# Altium footprint library Pcblib.PcbLib: 281 footprints (part 13 of 18)
Each footprint in its own frame and in the unit in brackets; x right, y up, seen from the top. Pads: shape width x height; smd on the part's side, far side on the other; paste and mask are expansions set on the pad; w line width, h text height; cw(c..) or ccw(c..) is an arc to the next point about the centre after c.
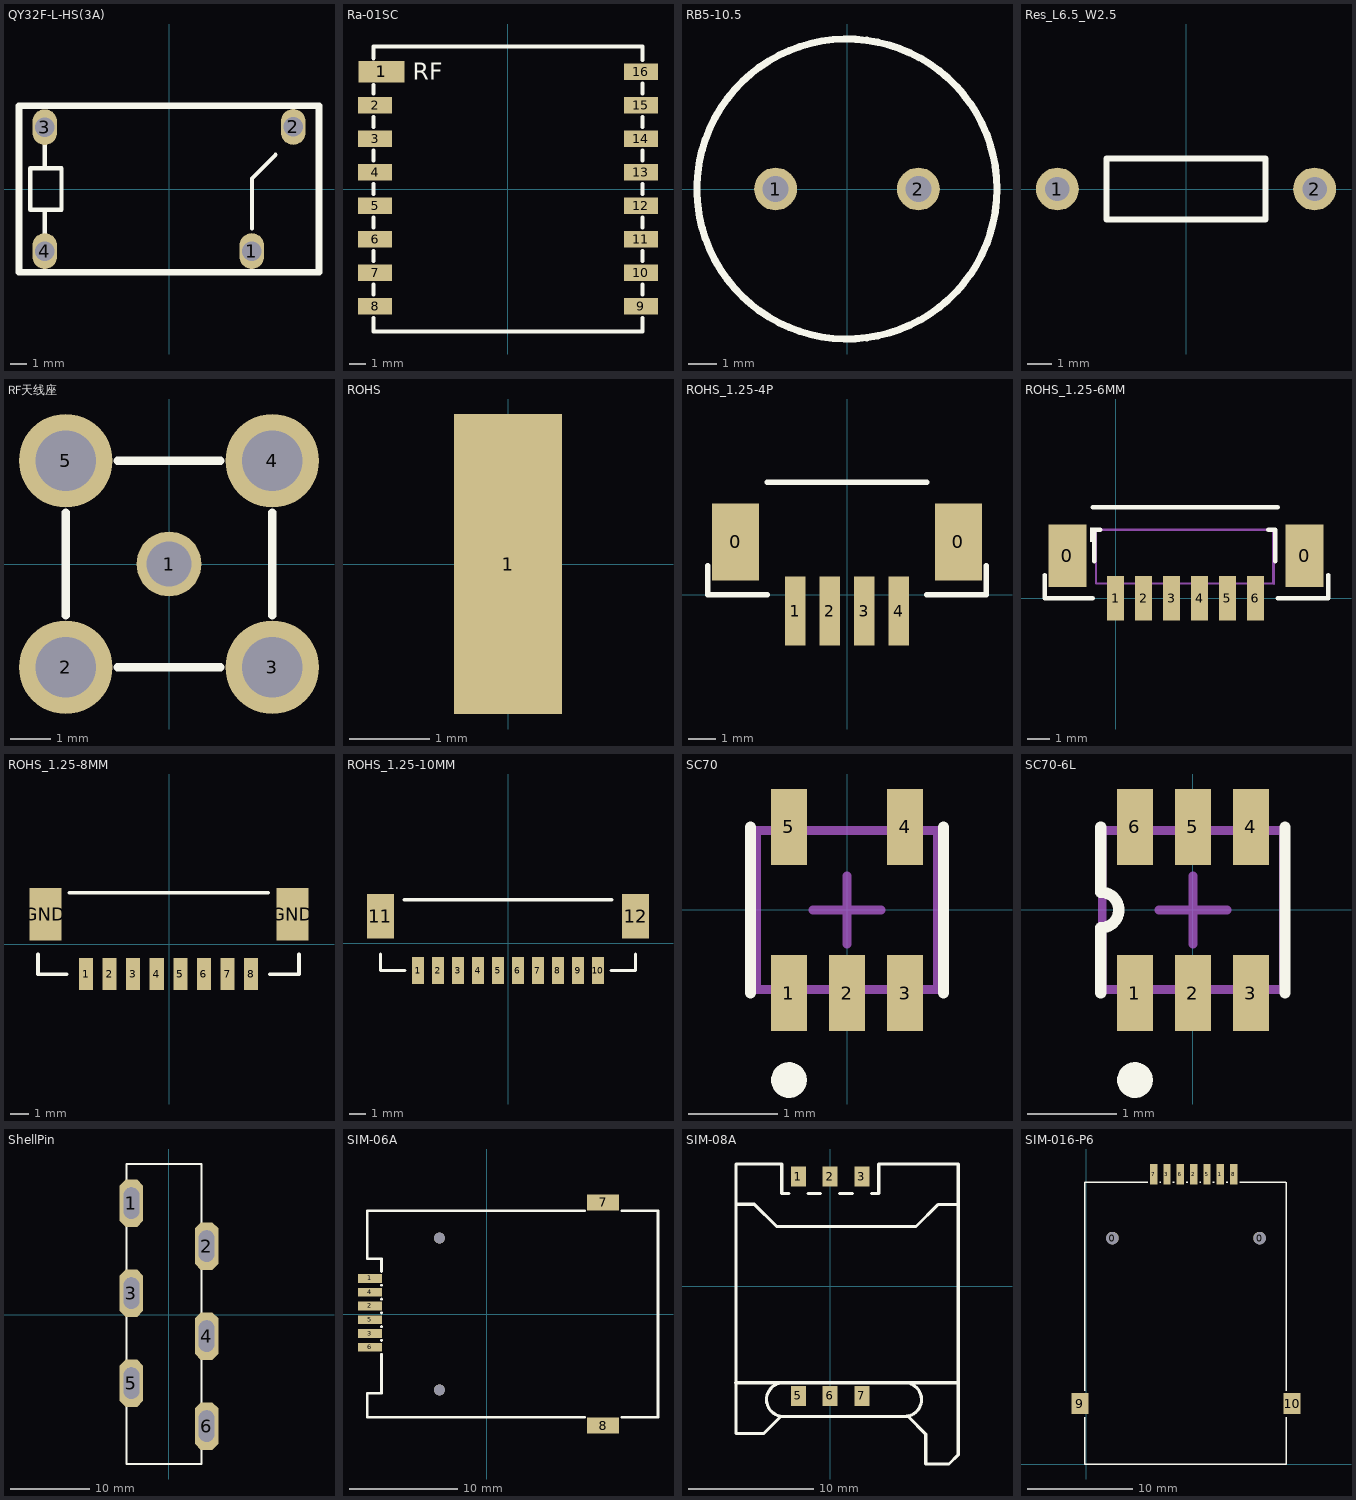
[diagram p12: the footprints below, top view; thin cyan lines are the x and y axes]

## QY32F-L-HS(3A) [mm] "单刀常开,长：18.4mm，宽：10.2mm，高：15.3mm"
pads (4):
  oval 1.5x2.2 hole 1.2: 1(5.08,-3.81) 2(7.62,3.81) 3(-7.62,3.79) 4(-7.62,-3.81)
Top Overlay:
  lines w0.254: -7.62,-2.794 -7.62,-1.27 ; -7.62,1.27 -7.62,2.794 ; 5.08,-2.413 5.08,0.635 6.542,2.097 ; -8.509,-1.27 -6.604,-1.27 -6.604,1.27 -8.509,1.27 -8.509,-1.27
  lines w0.4: -9.2,-5.1 9.2,-5.1 9.2,5.1 -9.2,5.1 -9.2,-5.1
3D body: height 0.4, standoff 0, extent -9.2,-5.1 9.2,5.1

## Ra-01SC [mm]
height 2.54
pads (16):
  rect 2.762x1.27 smd: 1(-7.549,7)
  rect 2.036x1 smd: 2(-7.932,5) 3(-7.932,3) 4(-7.932,1) 5(-7.932,-1) 6(-7.932,-3) 7(-7.932,-5) 8(-7.932,-7) 9(7.932,-7) 10(7.932,-5) 11(7.932,-3) 12(7.932,-1) 13(7.932,1) 14(7.932,3) 15(7.932,5) 16(7.932,7)
Top Overlay:
  lines w0.254: -8.031,-7.7 -8.031,-8.5 8.031,-8.5 8.031,-7.7 ; -8.031,-6.3 -8.031,-5.7 ; -8.031,-4.3 -8.031,-3.7 ; -8.031,-2.3 -8.031,-1.7 ; -8.031,-0.3 -8.031,0.3 ; -8.031,1.7 -8.031,2.3 ; -8.031,3.7 -8.031,4.3 ; -8.031,5.7 -8.031,6.2 ; -8.031,7.8 -8.031,8.5 8.031,8.5 8.031,7.7 ; 8.031,-6.3 8.031,-5.7 ; 8.031,-4.3 8.031,-3.7 ; 8.031,-2.3 8.031,-1.7 ; 8.031,-0.3 8.031,0.3 ; 8.031,1.7 8.031,2.3 ; 8.031,3.7 8.031,4.3 ; 8.031,5.7 8.031,6.3
  text "RF" at -5.669,6.51 h1.02

## RB5-10.5 [mm] "Motor, General Kind; 2 Leads"
pads (2):
  round 1.5 hole 0.9: 1(-2.5,0) 2(2.5,0)
Top Overlay:
  circle w0.25: c0,0 r5.25
Mechanical 1:
  circle w0.02: c0,0 r5.25

## Res_L6.5_W2.5 [mm]
pads (2):
  round 1.75 hole 1: 1(-5.25,0) 2(5.25,0)
Top Overlay:
  lines w0.254: -3.25,-1.25 3.25,-1.25 3.25,1.25 -3.25,1.25 -3.25,-1.25

## RF天线座 [mm]
pads (5):
  round 1.6 hole 1.1: 1(0,0)
  round 2.3 hole 1.5: 2(-2.54,-2.54) 3(2.54,-2.54) 4(2.54,2.54) 5(-2.54,2.54)
Top Overlay:
  lines w0.2: -2.54,-1.27 -2.54,1.27 ; -1.27,-2.54 1.27,-2.54 ; -1.27,2.54 1.27,2.54 ; 2.54,-1.27 2.54,1.27

## ROHS [mm]
pads (1):
  rect 1.35x3.75 smd: 1(0,0)

## ROHS_1.25-4P [mm] "Receptacle, 1.27mm, 6x1, SMT"
height 4.85
pads (6):
  rect 1.7x2.8 smd: 0(-4.034,1.905) 0(4.034,1.905)
  rect 0.75x2.5 smd: 1(-1.875,-0.6) 2(-0.625,-0.6) 3(0.625,-0.6) 4(1.875,-0.6)
Top Overlay:
  lines w0.2: -5.05,1.04 -5.05,0 -2.891,0 ; -2.891,4.064 2.891,4.064 ; 2.891,0 5.05,0 5.05,1.04

## ROHS_1.25-6MM [mm] "Receptacle, 1.27mm, 6x1, SMT"
height 4.85
pads (8):
  rect 1.7x2.8 smd: 0(-2.159,1.905) 0(8.45,1.905)
  rect 0.75x2 smd: 1(0,0) 2(1.25,0) 3(2.5,0) 4(3.75,0) 5(5,0) 6(6.25,0)
Top Overlay:
  rectangle: -1.145,2.508 -0.87,3.158
  lines w0.2: -3.175,1.04 -3.175,0 -1.016,0 ; -1.016,4.064 7.239,4.064 ; -0.961,1.651 -0.961,3.058 -0.695,3.058 ; 6.83,3.058 7.13,3.058 7.13,1.651 ; 7.239,0 9.505,0 9.505,1.04
Mechanical 5:
  rectangle: -1.145,2.509 -0.845,3.109
  lines w0.1: 7.05,0.658 7.05,3.058 ; 7.084,0.648 7.084,3.048 ; 7.084,0.658 -0.88,0.658 -0.88,3.058 7.084,3.058
3D body: height 0.6, standoff 0.5, extent -0.88,1.223 7.112,2.493
3D body: height 0.15, standoff 0, extent 6.205,0.208 6.605,1.373
3D body: height 0.5, standoff 0, extent 6.205,1.223 6.605,1.373
3D body: height 0.15, standoff 0, extent 3.665,0.208 4.065,1.373
3D body: height 0.5, standoff 0, extent 3.665,1.223 4.065,1.373
3D body: height 0.15, standoff 0, extent 1.125,0.208 1.525,1.373
3D body: height 0.5, standoff 0, extent 1.125,1.223 1.525,1.373
3D body: height 0.5, standoff 0, extent 4.935,2.343 5.335,2.493
3D body: height 0.5, standoff 0, extent 2.395,2.343 2.795,2.493
3D body: height 0.5, standoff 0, extent -0.145,2.343 0.255,2.493
3D body: height 4.85, standoff 4.65, extent 5.905,2.158 6.905,2.358
3D body: height 4.85, standoff 4.65, extent 5.905,1.358 6.105,2.358
3D body: height 4.85, standoff 4.65, extent 5.905,1.358 6.905,1.558
3D body: height 4.85, standoff 4.65, extent 6.705,1.358 6.905,2.358
3D body: height 4.85, standoff 4.65, extent 4.635,2.158 5.635,2.358
3D body: height 4.85, standoff 4.65, extent 4.635,1.358 4.835,2.358
3D body: height 4.85, standoff 4.65, extent 4.635,1.358 5.635,1.558
3D body: height 4.85, standoff 4.65, extent 5.435,1.358 5.635,2.358
3D body: height 4.85, standoff 4.65, extent 3.365,2.158 4.365,2.358
3D body: height 4.85, standoff 4.65, extent 3.365,1.358 3.565,2.358
3D body: height 4.85, standoff 4.65, extent 3.365,1.358 4.365,1.558
3D body: height 4.85, standoff 4.65, extent 4.165,1.358 4.365,2.358
3D body: height 4.85, standoff 4.65, extent 2.095,2.158 3.095,2.358
3D body: height 4.85, standoff 4.65, extent 2.095,1.358 2.295,2.358
3D body: height 4.85, standoff 4.65, extent 2.095,1.358 3.095,1.558
3D body: height 4.85, standoff 4.65, extent 2.895,1.358 3.095,2.358
3D body: height 4.85, standoff 4.65, extent 0.825,2.158 1.825,2.358
3D body: height 4.85, standoff 4.65, extent 0.825,1.358 1.025,2.358
3D body: height 4.85, standoff 4.65, extent 0.825,1.358 1.825,1.558
3D body: height 4.85, standoff 4.65, extent 1.625,1.358 1.825,2.358
3D body: height 4.85, standoff 4.65, extent 0.355,1.358 0.555,2.358
3D body: height 4.85, standoff 4.65, extent -0.445,1.358 0.555,1.558
3D body: height 4.85, standoff 4.65, extent -0.445,1.358 -0.245,2.358
3D body: height 4.85, standoff 4.65, extent -0.445,2.158 0.555,2.358
3D body: height 0.5, standoff 0.15, extent -0.88,0.658 7.112,1.223
3D body: height 0.5, standoff 0.15, extent -0.88,2.493 7.112,3.058
3D body: height 4.85, standoff 0.5, extent -0.88,1.858 6.985,3.058
3D body: height 4.85, standoff 0.5, extent 0.39,0.381 7.112,1.581
3D body: height 4.85, standoff 4.65, extent 5.455,1.358 5.655,2.358
3D body: height 4.85, standoff 4.65, extent 4.655,1.358 5.655,1.558
3D body: height 4.85, standoff 4.65, extent 4.655,1.358 4.855,2.358
3D body: height 4.85, standoff 4.65, extent 4.655,2.158 5.655,2.358
3D body: height 0.5, standoff 0, extent 4.955,1.223 5.355,1.373
3D body: height 0.15, standoff 0, extent 4.955,0.208 5.355,1.373

## ROHS_1.25-8MM [mm] "Receptacle, 1.27mm, 6x1, SMT"
height 4.85
pads (10):
  rect 0.75x1.7 smd: 1(-4.399,-1.587) 2(-3.149,-1.587) 3(-1.899,-1.587) 4(-0.649,-1.587) 5(0.601,-1.587) 6(1.851,-1.587) 7(3.101,-1.587) 8(4.351,-1.587)
  rect 1.7x2.8 smd: GND(-6.551,1.587) GND(6.551,1.587)
Top Overlay:
  lines w0.2: -6.939,-0.548 -6.939,-1.587 -5.415,-1.587 ; -5.288,2.73 5.253,2.73 ; 5.36,-1.587 6.884,-1.587 6.884,-0.548

## ROHS_1.25-10MM [mm] "Receptacle, 1.27mm, 6x1, SMT"
height 4.85
pads (12):
  rect 0.75x1.7 smd: 1(-5.625,-1.7) 2(-4.375,-1.7) 3(-3.125,-1.7) 4(-1.875,-1.7) 5(-0.625,-1.7) 6(0.625,-1.7) 7(1.875,-1.7) 8(3.125,-1.7) 9(4.375,-1.7) 10(5.625,-1.7)
  rect 1.7x2.8 smd: 11(-7.975,1.7) 12(7.975,1.7)
Top Overlay:
  lines w0.2: -7.975,-0.662 -7.975,-1.702 -6.451,-1.702 ; -6.5,2.73 6.5,2.73 ; 6.452,-1.7 7.976,-1.7 7.976,-0.66

## SC70 [mm]
pads (5):
  rect 0.4x0.85 smd: 1(-0.65,-0.93) 2(0,-0.93) 3(0.65,-0.93) 4(0.65,0.93) 5(-0.65,0.93)
Top Overlay:
  circle w0.2: c-0.65,-1.905 r0.1
  lines w0.127: -1.08,-0.93 -1.08,0.2 -1.08,0.93 ; 1.08,-0.93 1.08,0.93
Mechanical 13:
  lines w0.1: -1.016,-0.889 -1.016,0.889 1.016,0.889 1.016,-0.889 -1.016,-0.889
Mechanical 15:
  lines w0.1: -0.381,0 0.381,0 ; 0,-0.381 0,0.381
3D body: height 1.35, standoff 0, extent -1.016,-0.889 1.016,0.889

## SC70-6L [mm]
height 5.6
pads (6):
  rect 0.4x0.85 smd: 1(-0.65,-0.93) 2(0,-0.93) 3(0.65,-0.93) 4(0.65,0.93) 5(0,0.93) 6(-0.65,0.93)
Top Overlay:
  circle w0.2: c-0.65,-1.905 r0.1
  lines w0.127: -1.031,-0.93 -1.031,-0.2 ccw(c-1.031,0) -1.031,0.2 -1.031,0.93 ; 1.031,-0.93 1.031,0.93
Mechanical 13:
  lines w0.1: -1.016,-0.889 -1.016,0.889 1.016,0.889 1.016,-0.889 -1.016,-0.889
Mechanical 15:
  lines w0.1: -0.381,0 0.381,0 ; 0,-0.381 0,0.381
3D body: height 1.35, standoff 0, extent -1.016,-0.889 1.016,0.889

## ShellPin [mm]
pads (6):
  oct 3x6 hole 2 slot 4 at 90 deg: 1(-4.762,14.117) 2(4.763,8.683) 3(-4.762,2.717) 4(4.763,-2.717) 5(-4.762,-8.683) 6(4.763,-14.117)
Top Overlay:
  lines w0.254: -5.371,-18.917 -5.371,19.083 4.129,19.083 4.129,-18.917 -5.371,-18.917

## SIM-06A [mm]
pads (10):
  rect 2.2x0.8 smd: 1(-10.757,3.28) 2(-10.757,0.74) 3(-10.757,-1.8) 4(-10.757,2.01) 5(-10.757,-0.53) 6(-10.757,-3.07)
  rect 2.949x1.501 smd: 7(10.757,10.287) 8(10.757,-10.287)
  round 1 hole 1 unplated: ""(-4.346,-7) ""(-4.346,7)
Top Overlay:
  lines w0.254: -10.503,9.525 9.051,9.525 ; -10.4,9.525 -10.975,9.525 -11,9.5 -11,5.1 -9.7,5.1 -9.7,3.911 ; -9.7,-3.701 -9.7,-7.3 -11,-7.3 -11,-9.525 -10.503,-9.525 9.052,-9.525 ; -9.7,-2.439 -9.7,-2.431 ; -9.7,-1.169 -9.7,-1.161 ; -9.7,0.101 -9.7,0.109 ; -9.7,1.371 -9.7,1.379 ; -9.7,2.641 -9.7,2.649 ; 12.463,-9.525 15.811,-9.525 15.811,9.525 12.462,9.525

## SIM-08A [mm]
pads (6):
  rect 1.2x1.6 smd: 1(-2.54,8.776) 2(0,8.776) 3(2.54,8.776) 5(-2.54,-8.776) 6(0,-8.776) 7(2.54,-8.775)
Top Overlay:
  lines w0.254: -7.54,-7.729 10.25,-7.729 ; -7.53,-11.785 -5.295,-11.785 -3.923,-10.414 6.237,-10.414 7.659,-11.836 7.659,-13.716 7.659,-14.224 9.513,-14.224 10.25,-13.487 10.25,9.772 ; -7.53,-11.778 -7.53,9.772 ; -7.53,6.553 -6.057,6.553 -4.279,4.775 6.872,4.775 8.624,6.528 10.225,6.528 ; -7.53,9.779 -3.872,9.779 -3.872,7.417 -3.311,7.417 ; -3.8,-10.419 cw(c-3.736,-9.074) -3.698,-7.727 ; -1.769,7.417 -0.77,7.417 ; 0.77,7.417 1.77,7.417 ; 3.31,7.417 3.9,7.417 3.9,9.779 10.25,9.779 ; 5.932,-10.414 ccw(c5.97,-9.067) 6.034,-7.721

## SIM-016-P6 [mm]
pads (11):
  round 1.2 hole 1.2: 0(2.5,21.5) 0(16.5,21.5)
  rect 0.7x1.95 smd: 1(12.77,27.575) 2(10.23,27.575) 3(7.69,27.575) 5(11.5,27.575) 6(8.96,27.575) 7(6.42,27.575) 8(14.04,27.575)
  rect 1.6x2 smd: 9(-0.6,5.75) 10(19.6,5.75)
Top Overlay:
  lines w0.127: -0.127,4.445 -0.127,0 19.05,0 19.05,4.445 ; -0.127,6.985 -0.127,26.797 5.842,26.797 ; 6.985,26.797 7.112,26.797 ; 8.255,26.797 8.382,26.797 ; 9.525,26.797 9.652,26.797 ; 10.795,26.797 10.922,26.797 ; 12.065,26.797 12.192,26.797 ; 13.335,26.797 13.462,26.797 ; 14.605,26.797 19,26.797 ; 19.05,6.985 19.05,26.797